# Altium footprint library My_lib.PcbLib: 63 footprints (part 3 of 4)
Each footprint in its own frame and in the unit in brackets; x right, y up, seen from the top. Pads: shape width x height; smd on the part's side, far side on the other; paste and mask are expansions set on the pad; w line width, h text height; cw(c..) or ccw(c..) is an arc to the next point about the centre after c.
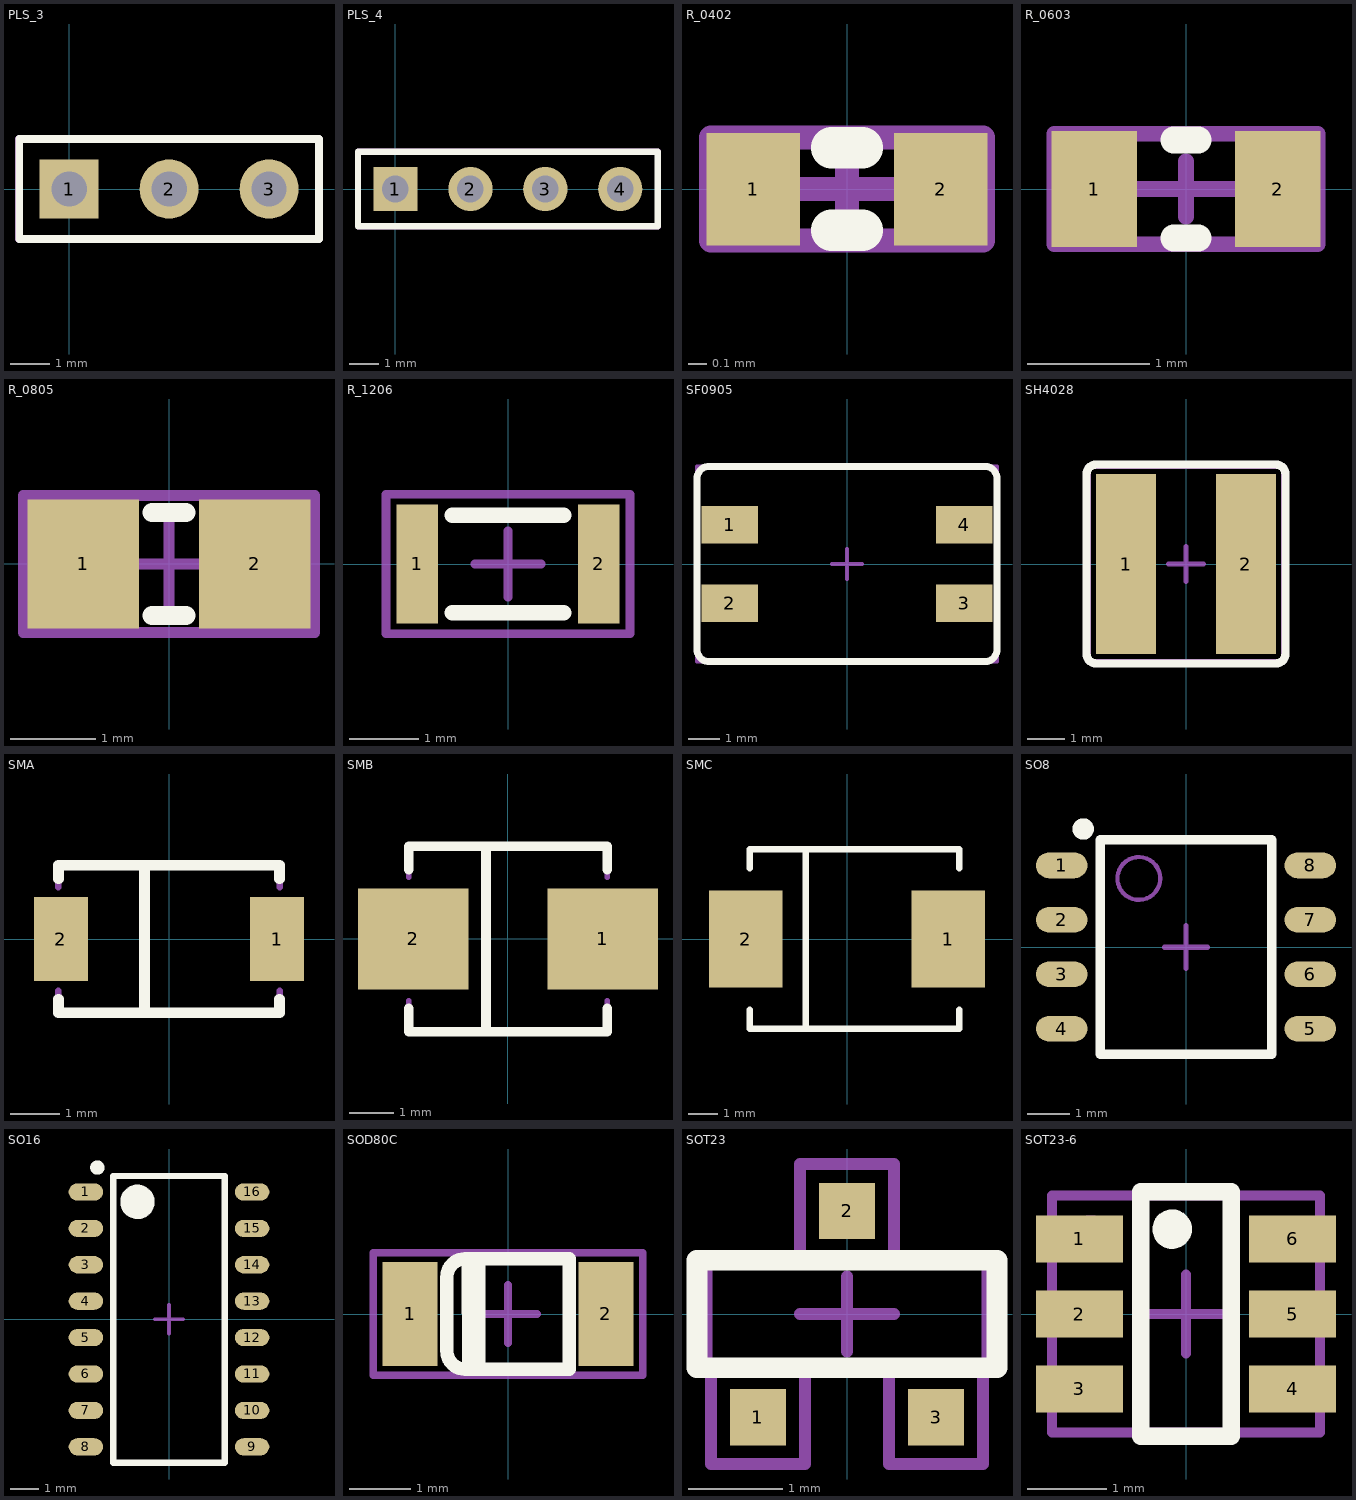
[diagram p2: the footprints below, top view; thin cyan lines are the x and y axes]

## PLS_3 [mm] "Connector; Header; 3 Position"
pads (3):
  rect 1.5x1.5 hole 0.9: 1(0,0)
  round 1.5 hole 0.9: 2(2.54,0) 3(5.08,0)
Top Overlay:
  lines w0.2: -1.27,-1.27 6.35,-1.27 6.35,1.27 -1.27,1.27 -1.27,-1.27
Top_Assy:
  lines w0.2: -1.275,-1.27 -1.275,1.27 6.345,1.27 6.345,-1.27 -1.275,-1.27
3D body: height 9.5, standoff -3.2, extent -1.27,-1.27 6.35,1.27

## PLS_4 [mm] "Connector; Header; 4 Position"
pads (4):
  rect 1.5x1.5 hole 0.9: 1(0,0)
  round 1.5 hole 0.9: 2(2.54,0) 3(5.08,0) 4(7.62,0)
Top Overlay:
  lines w0.22: -1.27,-1.27 8.89,-1.27 8.89,1.27 -1.27,1.27 -1.27,-1.27
Top_Assy:
  lines w0.2: -1.26,-1.27 -1.26,1.27 8.9,1.27 8.9,-1.27 -1.26,-1.27
3D body: height 9.5, standoff -3.2, extent -1.27,-1.27 8.89,1.27

## R_0402 [mm] "Chip, Body 1.6x0.85mm, IPC High Density"
height 0.9
pads (2):
  rect 0.5x0.6 smd mask+0.05: 1(-0.5,0) 2(0.5,0)
Top Overlay:
  lines w0.22: -0.083,-0.22 0.083,-0.22 ; -0.083,0.22 0.083,0.22
Top_Assy:
  lines w0.127: -0.4,0 0.4,0 ; 0,-0.1 0,0.1 ; -0.725,-0.275 -0.725,0.275 0.725,0.275 0.725,-0.275 -0.725,-0.275
3D body: height 0.3, standoff 0, extent -0.5,-0.25 0.5,0.25

## R_0603 [mm] "Chip, Body 1.6x0.85mm, IPC High Density"
height 0.9
pads (2):
  rect 0.7x0.95 smd mask+0.05: 1(-0.75,0) 2(0.75,0)
Top Overlay:
  lines w0.22: -0.1,-0.4 0.1,-0.4 ; -0.1,0.4 0.1,0.4
Top_Assy:
  lines w0.127: -0.4,0 0.4,0 ; 0,-0.225 0,0.225 ; -1.075,-0.45 1.075,-0.45 1.075,0.45 -1.075,0.45 -1.075,-0.45
3D body: height 0.45, standoff 0, extent -0.8,-0.4 0.8,0.4

## R_0805 [mm] "Chip, Body 1.6x0.85mm, IPC High Density"
height 0.45
pads (2):
  rect 1.3x1.5 smd: 1(-1,0) 2(1,0)
Top Overlay:
  lines w0.22: -0.2,-0.6 0.2,-0.6 ; -0.2,0.6 0.2,0.6
Top_Assy:
  lines w0.127: -0.475,0 0.475,0 ; 0,-0.475 0,0.475 ; -1.7,-0.8 1.7,-0.8 1.7,0.8 -1.7,0.8 -1.7,-0.8
3D body: height 0.5, standoff 0, extent -1,-0.63 1,0.62

## R_1206 [mm] "Chip, Body 3.2x1.6mm, IPC High Density"
height 0.5
pads (2):
  rect 0.6x1.7 smd: 1(-1.3,0) 2(1.3,0)
Top Overlay:
  lines w0.22: -0.8,-0.7 0.8,-0.7 ; -0.8,0.7 0.8,0.7
Top_Assy:
  lines w0.127: -0.475,0 0.475,0 ; 0,-0.475 0,0.475 ; -1.75,-1 -1.75,1 1.75,1 1.75,-1 -1.75,-1

## SF0905 [mm] "Chip Inductor, Body o7.5mm"
height 4
pads (4):
  rect 1.8x1.2 smd: 1(-3.75,1.25) 2(-3.75,-1.25) 3(3.75,-1.25) 4(3.75,1.25)
Top Overlay:
  lines w0.22: 4.409,-3.125 ccw(c4.409,-2.734) 4.8,-2.734 4.8,2.734 ccw(c4.409,2.734) 4.409,3.125 ; 4.5,-3.125 -4.409,-3.125 cw(c-4.409,-2.734) -4.8,-2.734 -4.8,2.734 cw(c-4.409,2.734) -4.409,3.125 4.5,3.125
Top_Assy:
  lines w0.127: -0.475,0 0.475,0 ; 0,-0.475 0,0.475 ; -4.8,-3.125 4.8,-3.125 4.8,3.125 -4.8,3.125 -4.8,-3.125
3D body: height 4.6, standoff -0.4, extent -4.6,-3 4.6,3

## SH4028 [mm] "Chip Inductor, Body ¦4.8mm"
height 2.8
pads (2):
  rect 1.6x4.8 smd: 1(-1.6,0) 2(1.6,0)
Top Overlay:
  lines w0.22: 2.65,-2.4 cw(c2.4,-2.4) 2.4,-2.65 -2.4,-2.65 cw(c-2.4,-2.4) -2.65,-2.4 -2.65,2.4 cw(c-2.4,2.4) -2.4,2.65 2.4,2.65 cw(c2.4,2.4) 2.65,2.4 ; 2.65,-2.375 2.65,2.425
Top_Assy:
  lines w0.127: -0.475,0 0.475,0 ; 0,-0.475 0,0.475 ; -2.6,-2.6 2.6,-2.6 2.6,2.6 -2.6,2.6 -2.6,-2.6
3D body: height 2.81, standoff 0, extent -2.4,-2.4 2.4,2.4

## SMA [mm] "SMA; 2 Leads"
height 2.5
pads (2):
  rect 1.1x1.7 smd: 1(2.2,0) 2(-2.2,0)
Top Overlay:
  lines w0.22: -2.25,-1.225 -2.25,-1.5 2.25,-1.5 2.25,-1.225 ; -2.25,1.225 -2.25,1.5 2.25,1.5 2.25,1.225 ; -0.5,-1.5 -0.5,1.5
Top_Assy:
  lines w0.127: -2.25,-1.05 -2.25,-1.5 2.25,-1.5 2.25,-1.05 ; -2.25,1.05 -2.25,1.5 2.25,1.5 2.25,1.05 ; -0.5,-1.5 -0.5,1.5
3D body: height 2.41, standoff 0, extent -2.65,-1.46 2.63,1.46

## SMB [mm] "SMB; 2 Leads"
height 2.5
pads (2):
  rect 2.5x2.3 smd: 1(2.15,0) 2(-2.15,0)
Top Overlay:
  lines w0.22: -2.25,-1.575 -2.25,-2.1 2.25,-2.1 2.25,-1.575 ; -2.25,1.575 -2.25,2.1 2.25,2.1 2.25,1.575 ; -0.5,-2.1 -0.5,2.1
Top_Assy:
  lines w0.127: -2.25,-1.4 -2.25,-2.1 2.25,-2.1 2.25,-1.4 ; -2.25,1.4 -2.25,2.1 2.25,2.1 2.25,1.4 ; -0.5,-2.1 -0.5,2.1
3D body: height 2.45, standoff 0.03, extent -2.75,-1.95 2.75,1.95

## SMC [mm] "SMC; 2 Leads"
height 2.5
pads (2):
  rect 2.5x3.3 smd: 1(3.45,0) 2(-3.45,0)
Top Overlay:
  lines w0.22: -3.302,-2.413 -3.302,-3.048 3.81,-3.048 3.81,-2.413 ; -3.302,2.413 -3.302,3.048 3.81,3.048 3.81,2.413 ; -1.397,-3.048 -1.397,3.048
Top_Assy:
  lines w0.127: -3.3,-2.413 -3.3,-3.048 3.812,-3.048 3.812,-2.413 ; -3.3,2.413 -3.3,3.048 3.812,3.048 3.812,2.413 ; -1.395,-3.048 -1.395,3.048

## SO8 [mm] "SOIC, 8-Leads, Body 6.1x4.95mm, Pitch 1.27mm, IPC Medium Density"
height 1.75
pads (8):
  oval 1.2x0.6 smd: 1(-2.9,1.905) 2(-2.9,0.635) 3(-2.9,-0.635) 4(-2.9,-1.905) 5(2.9,-1.905) 6(2.9,-0.635) 7(2.9,0.635) 8(2.9,1.905)
Top Overlay:
  circle w0.25: c-2.4,2.755 r0.125
  lines w0.22: -2,-2.5 -2,2.5 2,2.5 2,-2.5 -2,-2.5
Top_Assy:
  circle w0.1: c-1.1,1.6 r0.5
  lines w0.127: -0.5,0 0.5,0 ; 0,-0.5 0,0.5 ; -2,-2.5 -2,2.5 2,2.5 2,-2.5 -2,-2.5
3D body: height 1.76, standoff -0.01, extent -3.068,-2.445 3.068,2.445

## SO16 [mm] "SOIC, 16-Leads, Body 9.9x3.8mm, Pitch 1.27mm, IPC Medium Density"
height 1.75
pads (16):
  oval 1.2x0.6 smd: 1(-2.9,4.445) 2(-2.9,3.175) 3(-2.9,1.905) 4(-2.9,0.635) 5(-2.9,-0.635) 6(-2.9,-1.905) 7(-2.9,-3.175) 8(-2.9,-4.445) 9(2.9,-4.445) 10(2.9,-3.175) 11(2.9,-1.905) 12(2.9,-0.635) 13(2.9,0.635) 14(2.9,1.905) 15(2.9,3.175) 16(2.9,4.445)
Top Overlay:
  circle w0.25: c-2.5,5.295 r0.125
  circle w0.6: c-1.1,4.1 r0.3
  lines w0.22: -1.95,-5 -1.95,5 1.95,5 1.95,-5 -1.95,-5
Top_Assy:
  circle w0.1: c-1.1,4.1 r0.5
  lines w0.127: -0.5,0 0.5,0 ; 0,-0.5 0,0.5 ; -1.95,-5 -1.95,5 1.95,5 1.95,-5 -1.95,-5
3D body: height 1.75, standoff 0, extent -3,-5 3,5

## SOD80C [mm] "Chip, Body 3.7x1.6mm"
height 1.6
pads (2):
  rect 0.9x1.7 smd: 1(-1.6,0) 2(1.6,0)
Top Overlay:
  region: -0.75,-0.9 -0.755,0.9 -0.739,0.939 -0.7,0.955 -0.661,0.939 -0.648,0.906 -0.65,0.906 -0.652,0.906 -0.639,0.939 -0.6,0.955 -0.6,0.95 1,0.955 1.039,0.939 1.055,0.9 1.039,0.861 1,0.845 1,0.85 -0.375,0.85 -0.375,-0.85 1,-0.845 1.039,-0.861 1.055,-0.9 1.039,-0.939 1,-0.955 1,-0.95 -0.7,-0.955 -0.739,-0.939 -0.755,-0.9
  lines w0.22: -0.625,0.9 -0.6,0.9 ; -0.45,0.9 -0.425,0.9 ; -0.7,0.9 ccw(c-0.7,0.6) -1,0.6 -1,-0.6 ccw(c-0.7,-0.6) -0.7,-0.9 1,-0.9 1,0.9 -0.6,0.9 ; -0.7,0.9 -0.6,0.9 ; -0.7,0.9 -0.7,0.9
Top_Assy:
  lines w0.127: -0.475,0 0.475,0 ; 0,-0.475 0,0.475 ; -2.2,-1 2.2,-1 2.2,1 -2.2,1 -2.2,-1

## SOT23 [mm] "SOT23, 3-Leads, Body 2.9x1.3mm, Pitch 0.95mm, Lead Span 2.3mm - Reverse Pinning, IPC Medium Density"
height 1.1
pads (3):
  rect 0.6x0.6 smd: 1(-0.95,-1.1) 2(0,1.1) 3(0.95,-1.1)
Top Overlay:
  lines w0.22: -1.6,-0.575 1.6,-0.575 1.6,0.575 -1.6,0.575 -1.6,-0.575
Top_Assy:
  lines w0.127: -1.45,-0.6 -1.45,-1.6 -0.45,-1.6 -0.45,-0.6 ; -0.5,0 0.5,0 ; -0.5,0.6 -0.5,1.6 0.5,1.6 0.5,0.6 ; 0,-0.4 0,0.4 ; 0.45,-0.6 0.45,-1.6 1.45,-1.6 1.45,-0.6 ; -1.5,-0.6 -1.5,0.6 1.5,0.6 1.5,-0.6 -1.5,-0.6
3D body: height 1.01, standoff -0.01, extent -1.46,-1.25 1.46,1.226

## SOT23-6 [mm] "SOT23, 6-Leads, Body 2.9x1.6mm, Pitch 0.95mm, Lead Span 2.7mm, IPC Medium Density"
height 1.45
pads (6):
  rect 1.1x0.6 smd: 1(-1.35,0.95) 2(-1.35,0) 3(-1.35,-0.95) 4(1.35,-0.95) 5(1.35,0) 6(1.35,0.95)
Top Overlay:
  circle w0.25: c-0.175,1.075 r0.125
  lines w0.22: -0.575,-1.55 0.575,-1.55 0.575,1.55 -0.575,1.55 -0.575,-1.55
Top_Assy:
  circle w0.25: c-1.2,1 r0.125
  lines w0.127: -0.5,0 0.5,0 ; 0,-0.5 0,0.5 ; -1.7,-1.5 -1.7,1.5 1.7,1.5 1.7,-1.5 -1.7,-1.5
3D body: height 1.45, standoff 0, extent -1.4,-1.45 1.4,1.45